# Altium footprint library ref-packages-longpad.PCBLIB: 1527 footprints (part 16 of 103)
Each footprint in its own frame and in the unit in brackets; x right, y up, seen from the top. Pads: shape width x height; smd on the part's side, far side on the other; paste and mask are expansions set on the pad; w line width, h text height; cw(c..) or ccw(c..) is an arc to the next point about the centre after c.
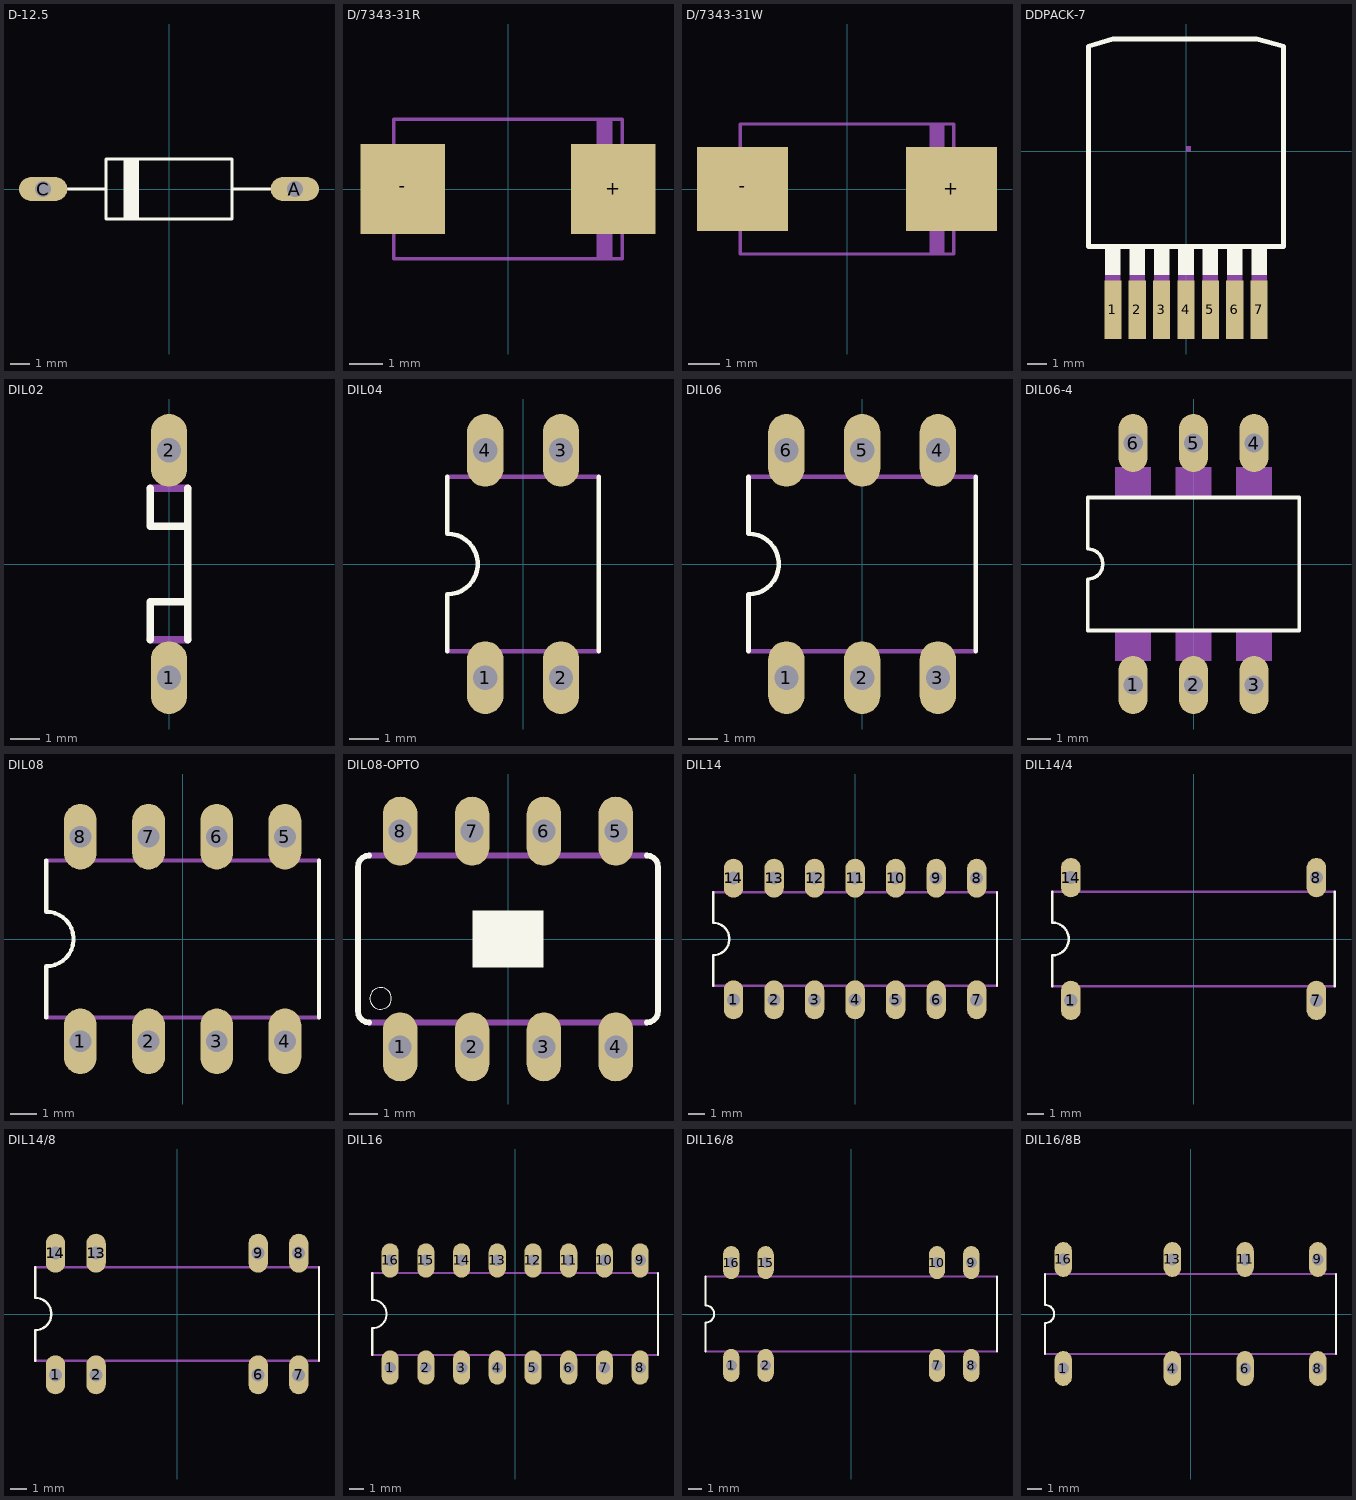
[diagram p15: the footprints below, top view; thin cyan lines are the x and y axes]

## D-12.5 [mil]
pads (2):
  oval 96x48 hole 32: A(250,0) C(-250,0)
Top Overlay:
  rectangle: -90,-60 -60,60
  rectangle: -90,-60 -60,60
  lines w6: -205,0 -125,0 ; 205,0 125,0 ; -125,0 -125,60 125,60 125,0 ; -125,0 -125,-60 125,-60 125,0

## D/7343-31R [mil]
pads (2):
  rect 100.39x106.3 smd: +(125,0) -(-125,0)
Mechanical 16:
  rectangle: -143.7,-47.24 -137.8,47.24
  rectangle: 137.8,-47.24 143.7,47.24
  rectangle: 105.32,-83.66 124.02,83.66
  lines w4: -135.83,-82.68 135.83,-82.68 135.83,82.68 -135.83,82.68 -135.83,-82.68

## D/7343-31W [mil]
pads (2):
  rect 116.14x106.3 smd: +(132.87,0) -(-132.87,0)
Mechanical 16:
  rectangle: -143.7,-47.24 -137.8,47.24
  rectangle: 137.8,-47.24 143.7,47.24
  rectangle: 105.32,-83.66 124.02,83.66
  lines w4: -135.83,-82.68 135.83,-82.68 135.83,82.68 -135.83,82.68 -135.83,-82.68

## DDPACK-7 [mil]
pads (7):
  rect 35x120 smd: 1(-150,-325) 2(-100,-325) 3(-50,-325) 4(0,-325) 5(50,-325) 6(100,-325) 7(150,-325)
Top Overlay:
  rectangle: -166,-254 -134,-198
  rectangle: -116,-254 -84,-198
  rectangle: -66,-254 -34,-198
  rectangle: -16,-254 16,-198
  rectangle: 34,-254 66,-198
  rectangle: 84,-254 116,-198
  rectangle: 134,-254 166,-198
  lines w10: -200,-195 -200,215 -150,230 145,230 200,215 200,-195 -200,-195
Mechanical 14:
  region: 0,0 10,0 10,10 0,10
Mechanical 16:
  rectangle: -166,-372 -134,-254
  rectangle: -116,-372 -84,-254
  rectangle: -66,-372 -34,-254
  rectangle: -16,-372 16,-254
  rectangle: 34,-372 66,-254
  rectangle: 84,-372 116,-254
  rectangle: 134,-372 166,-254

## DIL02 [mil]
pads (2):
  oval 48x96 hole 32: 1(0,-150) 2(0,150)
Top Overlay:
  lines w10: -25,-100 -25,-50 25,-50 ; -25,100 -25,50 25,50 ; 25,-100 25,-50 ; 25,100 25,50 ; 25,-50 25,50
Mechanical 16:
  lines w10: -25,-100 25,-100 ; -25,100 25,100

## DIL04 [mil]
pads (4):
  oval 48x96 hole 32: 1(-50,-150) 2(50,-150) 3(50,150) 4(-50,150)
Top Overlay:
  lines w6: -100,-115 -100,-40 ccw(c-100,0) -100,40 -100,115 ; 100,-115 100,115
Mechanical 16:
  lines w6: -100,-115 100,-115 ; -100,115 100,115

## DIL06 [mil]
pads (6):
  oval 48x96 hole 32: 1(-100,-150) 2(0,-150) 3(100,-150) 4(100,150) 5(0,150) 6(-100,150)
Top Overlay:
  lines w6: -150,-115 -150,-40 ccw(c-150,0) -150,40 -150,115 ; 150,-115 150,115
Mechanical 16:
  lines w6: -150,-115 150,-115 ; -150,115 150,115

## DIL06-4 [mil]
pads (6):
  oval 48x96 hole 32: 1(-100,-200) 2(0,-200) 3(100,-200) 4(100,200) 5(0,200) 6(-100,200)
Top Overlay:
  lines w6: -175,-110 -175,-25 ccw(c-175,0) -175,25 -175,110 175,110 175,-110 -175,-110
Mechanical 16:
  rectangle: 70,-160 130,-110
  rectangle: -30,-160 30,-110
  rectangle: -130,-160 -70,-110
  rectangle: -130,110 -70,160
  rectangle: -30,110 30,160
  rectangle: 70,110 130,160

## DIL08 [mil]
pads (8):
  oval 48x96 hole 32: 1(-150,-150) 2(-50,-150) 3(50,-150) 4(150,-150) 5(150,150) 6(50,150) 7(-50,150) 8(-150,150)
Top Overlay:
  lines w6: -200,-115 -200,-40 ccw(c-200,0) -200,40 -200,115 ; 200,-115 200,115
Mechanical 16:
  lines w6: -200,-115 200,-115 ; -200,115 200,115

## DIL08-OPTO [mil]
pads (8):
  oval 48x96 hole 32: 1(-150,-150) 2(-50,-150) 3(50,-150) 4(150,-150) 5(150,150) 6(50,150) 7(-50,150) 8(-150,150)
Top Overlay:
  circle w0: c0,-1.97 r0.38
  circle w0: c-177.17,-82.68 r14.96
  rectangle: -49.21,-39.37 49.21,39.37
  lines w8: -192.91,-116.14 cw(c-192.91,-100.39) -208.66,-100.39 -208.66,100.39 cw(c-192.91,100.39) -192.91,116.14 ; 192.91,-116.14 ccw(c192.91,-100.39) 208.66,-100.39 208.66,100.39 ccw(c192.91,100.39) 192.91,116.14
Mechanical 16:
  lines w8: -192.91,-116.14 192.91,-116.14 ; -192.91,116.14 192.91,116.14

## DIL14 [mil]
pads (14):
  oval 48x96 hole 32: 1(-300,-150) 2(-200,-150) 3(-100,-150) 4(0,-150) 5(100,-150) 6(200,-150) 7(300,-150) 8(300,150) 9(200,150) 10(100,150) 11(0,150) 12(-100,150) 13(-200,150) 14(-300,150)
Top Overlay:
  lines w6: -350,-115 -350,-40 ccw(c-350,0) -350,40 -350,115 ; 350,-115 350,115
Mechanical 16:
  lines w6: -350,-115 350,-115 ; -350,115 350,115

## DIL14/4 [mil]
pads (4):
  oval 48x96 hole 32: 1(-300,-150) 7(300,-150) 8(300,150) 14(-300,150)
Top Overlay:
  lines w6: -345,-115 -345,-40 ccw(c-345,0) -345,40 -345,115 ; 345,-115 345,115
Mechanical 16:
  lines w6: -345,-115 345,-115 ; -345,115 345,115

## DIL14/8 [mil]
pads (8):
  oval 48x96 hole 32: 1(-300,-150) 2(-200,-150) 6(200,-150) 7(300,-150) 8(300,150) 9(200,150) 13(-200,150) 14(-300,150)
Top Overlay:
  lines w6: -350,-115 -350,-40 ccw(c-350,0) -350,40 -350,115 ; 350,-115 350,115
Mechanical 16:
  lines w6: -350,-115 350,-115 ; -350,115 350,115

## DIL16 [mil]
pads (16):
  oval 48x96 hole 32: 1(-350,-150) 2(-250,-150) 3(-150,-150) 4(-50,-150) 5(50,-150) 6(150,-150) 7(250,-150) 8(350,-150) 9(350,150) 10(250,150) 11(150,150) 12(50,150) 13(-50,150) 14(-150,150) 15(-250,150) 16(-350,150)
Top Overlay:
  lines w6: -400,-115 -400,-40 ccw(c-400,0) -400,40 -400,115 ; 400,-115 400,115
Mechanical 16:
  lines w6: -400,-115 400,-115 ; -400,115 400,115

## DIL16/8 [mil]
pads (8):
  oval 48x96 hole 32: 1(-350,-150) 2(-250,-150) 7(250,-150) 8(350,-150) 9(350,150) 10(250,150) 15(-250,150) 16(-350,150)
Top Overlay:
  lines w6: -425,-110 -425,-25 ccw(c-425,0) -425,25 -425,110 ; 425,-110 425,110
Mechanical 16:
  lines w6: -425,-110 425,-110 ; -425,110 425,110

## DIL16/8B [mil]
pads (8):
  oval 48x96 hole 32: 1(-350,-150) 4(-50,-150) 6(150,-150) 8(350,-150) 9(350,150) 11(150,150) 13(-50,150) 16(-350,150)
Top Overlay:
  lines w6: -400,-110 -400,-25 ccw(c-400,0) -400,25 -400,110 ; 400,-110 400,110
Mechanical 16:
  lines w6: -400,-110 400,-110 ; -400,110 400,110